# Altium footprint library SMD_SEMI.PcbLib: 101 footprints (part 7 of 7)
Each footprint in its own frame and in the unit in brackets; x right, y up, seen from the top. Pads: shape width x height; smd on the part's side, far side on the other; paste and mask are expansions set on the pad; w line width, h text height; cw(c..) or ccw(c..) is an arc to the next point about the centre after c.
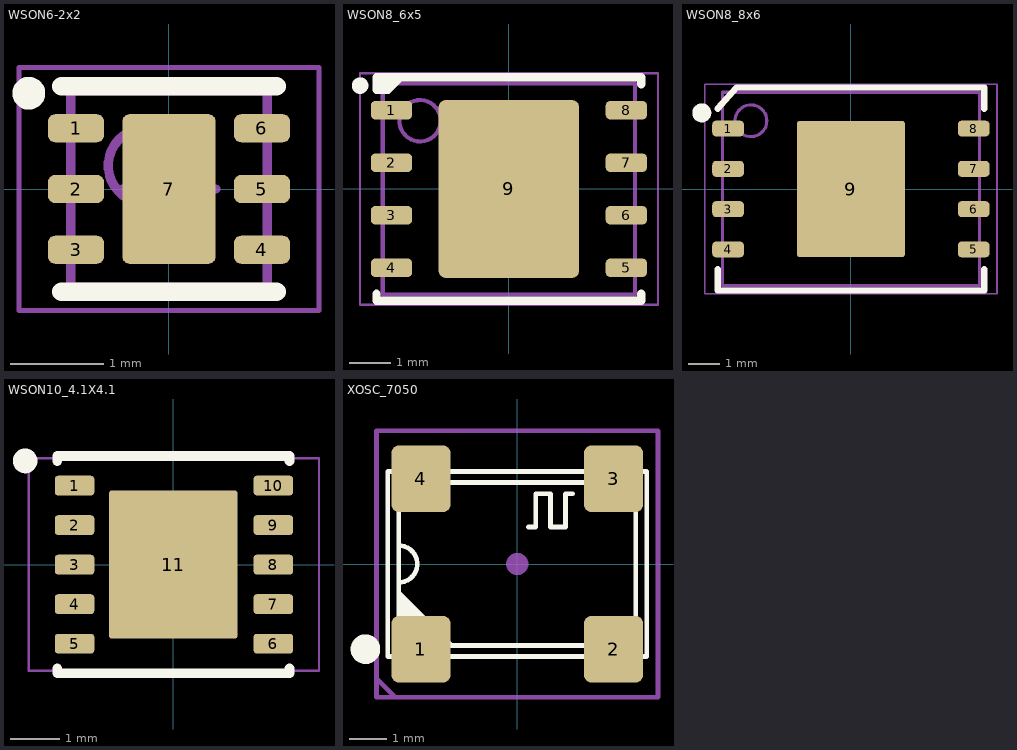
[diagram p6: the footprints below, top view; thin cyan lines are the x and y axes]

## WSON6-2x2 [mm]
height 0.8
pads (7):
  rrect50% 0.6x0.3 smd: 1(-0.995,0.65) 2(-0.995,0) 3(-0.995,-0.65) 4(0.995,-0.65) 5(0.995,0) 6(0.995,0.65)
  rrect15% 1x1.6 smd: 7(0,0)
Top Overlay:
  circle w0.2: c-1.5,1.025 r0.075
  lines w0.2: -1.15,-1.1 1.15,-1.1 ; -1.15,1.1 1.15,1.1
Mechanical 13:
  circle w0.1: c-0.25,0.25 r0.4
  lines w0.1: -1.05,-1.05 1.05,-1.05 1.05,1.05 -1.05,1.05 -1.05,-1.05
Mechanical 15:
  lines w0.05: -1.605,-1.3 1.605,-1.3 1.605,1.3 -1.605,1.3 -1.605,-1.3
  lines w0.1: -0.5,0 0.5,0 ; 0,-0.5 0,0.5
3D body "WSON6-2x2.step": height 0.8, standoff 0, extent -1.15,-1.05 1.15,1.05

## WSON8_6x5 [mm]
height 0.8
pads (9):
  rrect50% 1x0.45 smd: 1(-2.84,1.905) 2(-2.84,0.635) 3(-2.84,-0.635) 4(-2.84,-1.905) 5(2.84,-1.905) 6(2.84,-0.635) 7(2.84,0.635) 8(2.84,1.905)
  rrect10% 3.4x4.3 smd paste-1.7: 9(0,0)
Top Overlay:
  circle w0.3: c-3.6,2.5 r0.05
  rectangle: -3.2,2.3 -2.9,2.7
  region: -2.9,2.3 -2.5,2.7 -3.033,2.7
  lines w0.2: -3.2,-2.53 -3.2,-2.7 -2.44,-2.7 ; -3.2,2.4 -3.2,2.5 ; -3.2,2.53 -3.2,2.7 -2.44,2.7 ; -2.6,-2.7 2.4,-2.7 ; -2.6,2.7 2.5,2.7 ; 2.44,-2.7 3.2,-2.7 3.2,-2.53 ; 2.44,2.7 3.2,2.7 3.2,2.53
Top Paste:
  rectangle: 0.665,-2.045 1.595,-0.815
  rectangle: 0.665,-0.615 1.595,0.615
  rectangle: 0.665,0.815 1.595,2.045
  rectangle: -0.465,-2.045 0.465,-0.815
  rectangle: -0.465,-0.615 0.465,0.615
  rectangle: -0.465,0.815 0.465,2.045
  rectangle: -1.595,-2.045 -0.665,-0.815
  rectangle: -1.595,-0.615 -0.665,0.615
  rectangle: -1.595,0.815 -0.665,2.045
Mechanical 13:
  circle w0.1: c-2.15,1.65 r0.5
  lines w0.1: -3.05,-2.55 3.05,-2.55 3.05,2.55 -3.05,2.55 -3.05,-2.55
Mechanical 15:
  lines w0.05: -3.605,-2.8 3.605,-2.8 3.605,2.8 -3.605,2.8 -3.605,-2.8
  lines w0.1: -0.5,0 0.5,0 ; 0,-0.5 0,0.5
3D body "WSON8_6x5.step": height 0.8, standoff 0, extent -3.1,-2.55 3.1,2.55

## WSON8_8x6 [mm] "SON, 8-Leads, Body 6.00x8.00mm, Pitch 1.27mm, Thermal Pad 4.30x3.40mm, IPC Medium Density"
height 0.8
pads (9):
  rrect50% 1x0.5 smd: 1(-3.87,1.905) 2(-3.87,0.635) 3(-3.87,-0.635) 4(-3.87,-1.905) 5(3.87,-1.905) 6(3.87,-0.635) 7(3.87,0.635) 8(3.87,1.905)
  rrect5% 3.4x4.3 smd paste-1.7: 9(0,0)
Top Overlay:
  circle w0.3: c-4.7,2.4 r0.15
  lines w0.2: -4.2,-2.53 -4.2,-3.2 -3.495,-3.2 3.495,-3.2 4.2,-3.2 4.2,-2.53 ; -4.2,2.53 -3.6,3.2 3.495,3.2 4.2,3.2 4.2,2.53
Top Paste:
  rectangle: 0.665,-2.045 1.595,-0.815
  rectangle: 0.665,-0.615 1.595,0.615
  rectangle: 0.665,0.815 1.595,2.045
  rectangle: -0.465,-2.045 0.465,-0.815
  rectangle: -0.465,-0.615 0.465,0.615
  rectangle: -0.465,0.815 0.465,2.045
  rectangle: -1.595,-2.045 -0.665,-0.815
  rectangle: -1.595,-0.615 -0.665,0.615
  rectangle: -1.595,0.815 -0.665,2.045
Mechanical 13:
  circle w0.1: c-3.15,2.15 r0.5
  lines w0.1: -4.05,-3.05 4.05,-3.05 4.05,3.05 -4.05,3.05 -4.05,-3.05
Mechanical 15:
  lines w0.05: -4.605,-3.3 4.605,-3.3 4.605,3.3 -4.605,3.3 -4.605,-3.3
  lines w0.1: -0.5,0 0.5,0 ; 0,-0.5 0,0.5
3D body "WSON8_8x6.step": height 0.8, standoff 0, extent -4.15,-3.05 4.15,3.05

## WSON10_4.1X4.1 [mm] "4.1×4.1×0.8"
pads (11):
  rrect33% 0.8x0.4 smd paste-0.15 mask+0.051: 1(-2,1.6) 2(-2,0.8) 3(-2,0) 4(-2,-0.8) 5(-2,-1.6) 6(2.025,-1.6) 7(2.025,-0.8) 8(2.025,0) 9(2.025,0.8) 10(2.025,1.6)
  rrect4% 2.6x3 smd paste-1.3 mask+0.051: 11(0,0)
Top Overlay:
  circle w0.25: c-3,2.1 r0.125
  lines w0.2: -2.35,-2.2 -2.35,-2.1 ; -2.35,2.1 -2.35,2.2 ; -2.345,-2.2 -1.7,-2.2 ; -2.345,2.2 -1.7,2.2 ; -1.85,-2.2 1.9,-2.2 ; -1.825,2.2 1.9,2.2 ; 1.7,-2.2 2.345,-2.2 ; 1.7,2.2 2.345,2.2 ; 2.35,-2.2 2.35,-2.1 ; 2.35,2.1 2.35,2.2
Top Paste:
  region: 2.4,1.75 1.7,1.75 1.7,1.45 2.4,1.45
  region: 2.4,0.95 1.7,0.95 1.7,0.65 2.4,0.65
  region: 2.4,0.15 1.7,0.15 1.7,-0.15 2.4,-0.15
  region: 2.4,-0.65 1.7,-0.65 1.7,-0.95 2.4,-0.95
  region: 2.4,-1.45 1.7,-1.45 1.7,-1.75 2.4,-1.75
  rectangle: -2.4,-1.75 -1.7,-1.45
  rectangle: -2.4,-0.95 -1.7,-0.65
  rectangle: -2.4,-0.15 -1.7,0.15
  rectangle: -2.4,0.65 -1.7,0.95
  rectangle: -2.4,1.45 -1.7,1.75
  rectangle: 0.1,0.1 1.2,1.4
  region: -0.1,1.4 -1.2,1.4 -1.2,0.1 -0.1,0.1
  region: -0.1,-0.1 -1.2,-0.1 -1.2,-1.4 -0.1,-1.4
  rectangle: 0.1,-1.4 1.2,-0.1
Mechanical 1:
  text ".Designator" at -2.3,2.5 h0.8
Mechanical 15:
  circle w0.25: c0,0 r0.125
  lines w0.05: -2.925,-2.15 -2.925,2.15 2.95,2.15 2.95,-2.15 -2.925,-2.15
3D body "User Library-PWSON-N10_1EPThermalVia_4_1x4_1mm_P0_8mm.STEP": height 0.75, standoff 0, extent -2,-2 2,2

## XOSC_7050 [mm]
height 3.1
pads (4):
  rrect25% 1.6x1.8 smd: 1(-2.6,-2.3) 2(2.6,-2.3) 3(2.6,2.3) 4(-2.6,2.3)
Top Overlay:
  circle w0.4: c-4.1,-2.3 r0.2
  region: -3.2,-0.7 -1.7,-2.2 -3.2,-2.2
  lines w0.127: -3.2,-0.5 ccw(c-3.2,0) -3.2,0.5 ; 0.3,1 0.5,1 0.5,1.9 0.9,1.9 0.9,1 1.3,1 1.3,1.9 1.5,1.9 ; -3.5,-2.5 3.5,-2.5 3.5,2.5 -3.5,2.5 -3.5,-2.5 ; -3.2,-2.2 3.2,-2.2 3.2,2.2 -3.2,2.2 -3.2,-2.2
Mechanical 15:
  circle w0.4: c0,0 r0.1
  lines w0.127: -3.8,-3.3 -3.8,-3.1 -3.3,-3.6 -3.2,-3.6 ; -3.8,-3.6 -3.8,3.6 3.8,3.6 3.8,-3.6 0.9,-3.6 -3.8,-3.6
3D body: height 1.3, standoff 0, extent 2.137,2.108 3.052,2.489
3D body: height 1.3, standoff 0, extent -3.063,2.108 -2.148,2.489
3D body: height 1.3, standoff 0, extent -3.052,-2.49 -2.137,-1.765
3D body: height 1.3, standoff 0, extent 2.148,-2.489 3.063,-2.108
3D body "User Library-7W_TXC.step": height 1.3, standoff 0, extent -3.497,-2.487 3.504,2.513